# Altium footprint library Mine.PcbLib: 306 footprints (part 13 of 20)
Each footprint in its own frame and in the unit in brackets; x right, y up, seen from the top. Pads: shape width x height; smd on the part's side, far side on the other; paste and mask are expansions set on the pad; w line width, h text height; cw(c..) or ccw(c..) is an arc to the next point about the centre after c.
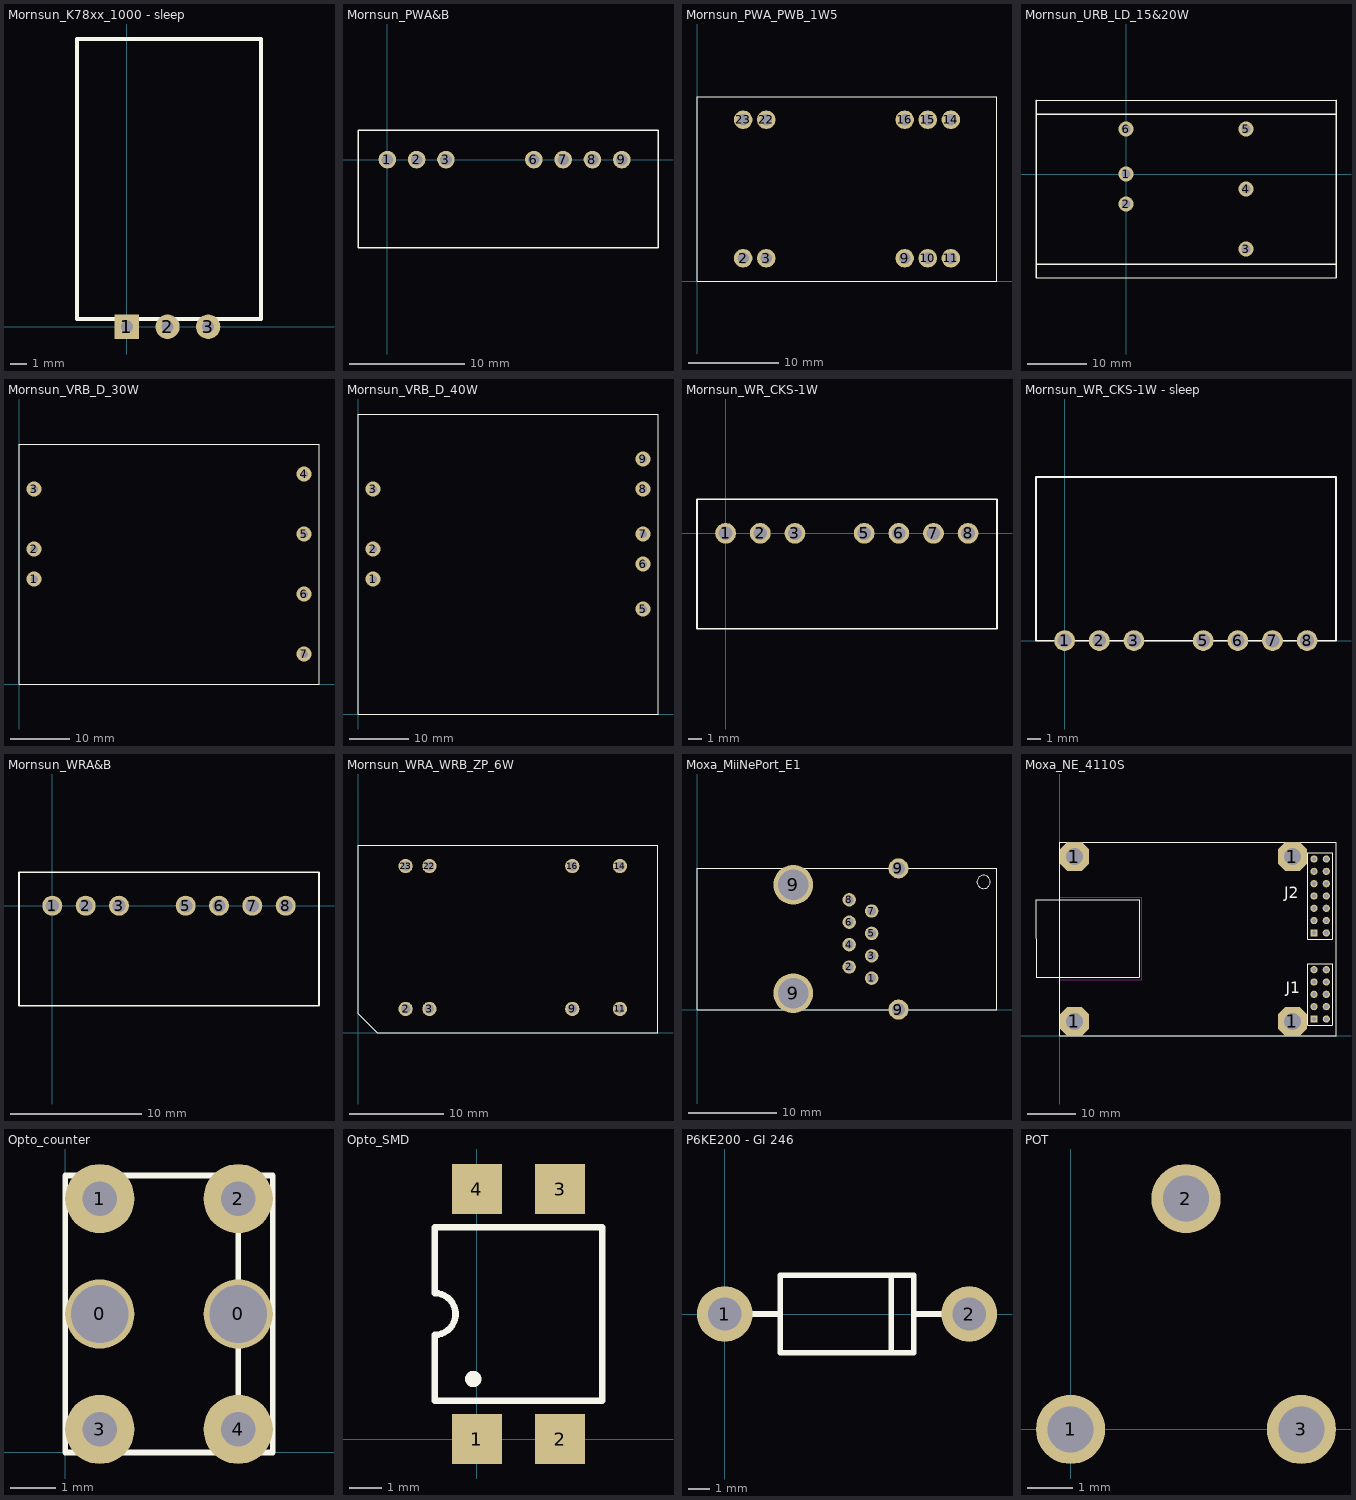
[diagram p12: the footprints below, top view; thin cyan lines are the x and y axes]

## Mornsun_K78xx_1000 - sleep [mil]
height 354.33
pads (3):
  rect 60x60 hole 30: 1(0,0)
  round 60 hole 30: 2(100,0) 3(200,0)
Top Overlay:
  lines w10: -122.76,19.68 330,19.68 330,708.66 -122.76,708.66 -122.76,19.68

## Mornsun_PWA&B [mil]
height 492.13
pads (7):
  round 60 hole 40: 1(0,0) 2(100,0) 3(200,0) 6(500,0) 7(600,0) 8(700,0) 9(800,0)
Top Overlay:
  lines w5: -100,-300 923.62,-300 923.62,100 -100,100 -100,-300

## Mornsun_PWA_PWB_1W5 [mil]
height 393.7
pads (10):
  round 80 hole 50: 2(200,100) 3(300,100) 9(900,100) 10(1000,100) 11(1100,100) 14(1100,700) 15(1000,700) 16(900,700) 22(300,700) 23(200,700)
Top Overlay:
  lines w5: 0,0 1300,0 1300,800 0,800 0,0

## Mornsun_URB_LD_15&20W [mil] "Mornsun"
height 464.57
pads (6):
  round 100 hole 60: 1(0,0) 2(0,-200) 3(800,-500) 4(800,-100) 5(800,300) 6(0,300)
Top Overlay:
  lines w5: -600,-690.55 1400,-690.55 ; -600,490.55 1400,490.55
  lines w10: -600,-690.55 -600,490.55 ; -600,-600 1400,-600 ; -600,400 1400,400 ; 1400,-690.55 1400,490.55

## Mornsun_VRB_D_30W [mil]
height 464.57
pads (7):
  round 100 hole 50: 1(100,700) 2(100,900) 3(100,1300) 4(1900,1400) 5(1900,1000) 6(1900,600) 7(1900,200)
Top Overlay:
  lines w5: 0,0 2000,0 2000,1600 0,1600 0,0

## Mornsun_VRB_D_40W [mil]
height 464.57
pads (8):
  round 100 hole 50: 1(100,900) 2(100,1100) 3(100,1500) 5(1900,700) 6(1900,1000) 7(1900,1200) 8(1900,1500) 9(1900,1700)
Top Overlay:
  lines w5: 0,0 0,2000 2000,2000 2000,0 0,0

## Mornsun_WR_CKS-1W [mil] "Mornsun"
height 472.44
pads (7):
  round 60 hole 40: 1(0,0) 2(100,0) 3(200,0) 5(400,0) 6(500,0) 7(600,0) 8(700,0)
Top Overlay:
  lines w5: -82.68,-275.59 783.46,-275.59 783.46,98.43 -82.68,98.43 -82.68,-275.59

## Mornsun_WR_CKS-1W - sleep [mil] "Mornsun"
height 374.02
pads (7):
  round 60 hole 40: 1(0,0) 2(100,0) 3(200,0) 5(400,0) 6(500,0) 7(600,0) 8(700,0)
Top Overlay:
  lines w5: -82.68,0 -82.68,472.44 783.46,472.44 783.46,0 -82.68,0

## Mornsun_WRA&B [mil]
height 472.44
pads (7):
  round 60 hole 40: 1(0,0) 2(100,0) 3(200,0) 5(400,0) 6(500,0) 7(600,0) 8(700,0)
Top Overlay:
  lines w5: -100,-300 800,-300 800,100 -100,100 -100,-300

## Mornsun_WRA_WRB_ZP_6W [mil]
height 393.7
pads (8):
  round 60 hole 40: 2(200,100) 3(300,100) 9(900,100) 11(1100,100) 14(1100,700) 16(900,700) 22(300,700) 23(200,700)
Top Overlay:
  lines w5: 0,80 80,0 1259.84,0 1259.84,787.4 0,787.4 0,80

## Moxa_MiiNePort_E1 [mil]
height 551.18
pads (12):
  round 60 hole 40: 1(780,140) 2(680,190) 3(780,240) 4(680,290) 5(780,340) 6(680,390) 7(780,440) 8(680,490)
  round 177.17 hole 137.8: 9(430,72.87) 9(430,557.13)
  round 90 hole 60: 9(900,0) 9(900,630)
Top Overlay:
  circle w5: c1280,570 r29.53
  lines w5: 0,0 1340,0 1340,630 0,630 0,0

## Moxa_NE_4110S [mm]
height 15.5
pads (28):
  oct 6x6 hole 3.5: 1(3,3.005) 1(3,37.005) 1(48,3.005) 1(48,37.005)
  rect 1.5x1.5 hole 0.9: 1_1(52.46,3.505) 2_1(52.46,21.265)
  round 1.5 hole 0.9: 1_2(55,3.505) 1_3(52.46,6.045) 1_4(55,6.045) 1_5(52.46,8.585) 1_6(55,8.585) 1_7(52.46,11.125) 1_8(55,11.125) 1_9(52.46,13.665) 1_10(55,13.665) 2_2(55,21.265) 2_3(52.46,23.805) 2_4(55,23.805) 2_5(52.46,26.345) 2_6(55,26.345) 2_7(52.46,28.885) 2_8(55,28.885) 2_9(52.46,31.425) 2_10(55,31.425) 2_11(52.46,33.965) 2_12(55,33.965) 2_13(52.46,36.505) 2_14(55,36.505)
Top Overlay:
  lines w0.127: -4.918,12.069 -4.919,28.069 16.439,28.069 16.439,12.069 -4.918,12.069 ; 0,0.005 0,40.005 57,40.005 57,0.005 0,0.005
  lines w0.2: 51.19,2.235 51.19,14.935 56.27,14.935 56.27,2.235 51.19,2.235 ; 51.19,19.995 56.27,19.995 56.27,37.775 51.19,37.775 51.19,19.995
  text "J2" at 46.355,27.559 h4
  text "J1" at 46.609,8.001 h4
Keep-Out Layer:
  lines w0.254: 0,11.561 16.947,11.561 16.947,28.577 0,28.577

## Opto_counter [mil]
pads (6):
  round 60 hole 50: 0(30,120) 0(150,120)
  round 60 hole 30: 1(30,220) 2(150,220) 3(30,20) 4(150,20)
Top Overlay:
  lines w5: 150,0 150,240 ; 0,0 0,240 180,240 180,0 0,0

## Opto_SMD [mil]
pads (4):
  rect 60x60 smd: 1(0,0) 2(100,0) 3(100,300) 4(0,300)
Top Overlay:
  circle w10: c-4.18,72 r4.82
  lines w7.87: -50.39,45.67 -50.39,125 ccw(c-50.39,150) -50.39,175 -50.39,254.33 150.39,254.33 150.39,45.67 -50.39,45.67

## P6KE200 - GI 246 [mil]
height 196.85
pads (2):
  round 100 hole 60: 1(0,0) 2(440,0)
Top Overlay:
  lines w10: 45,0 100,0 ; 300,-70 300,70 ; 340,0 395,0 ; 100,0 100,-70 340,-70 340,70 100,70 100,0

## POT [mil]
pads (3):
  round 60 hole 40: 1(0,0) 2(100,200) 3(200,0)